# Altium footprint library STM32F103_Warship.PcbLib: 55 footprints (part 1 of 4)
Each footprint in its own frame and in the unit in brackets; x right, y up, seen from the top. Pads: shape width x height; smd on the part's side, far side on the other; paste and mask are expansions set on the pad; w line width, h text height; cw(c..) or ccw(c..) is an arc to the next point about the centre after c.
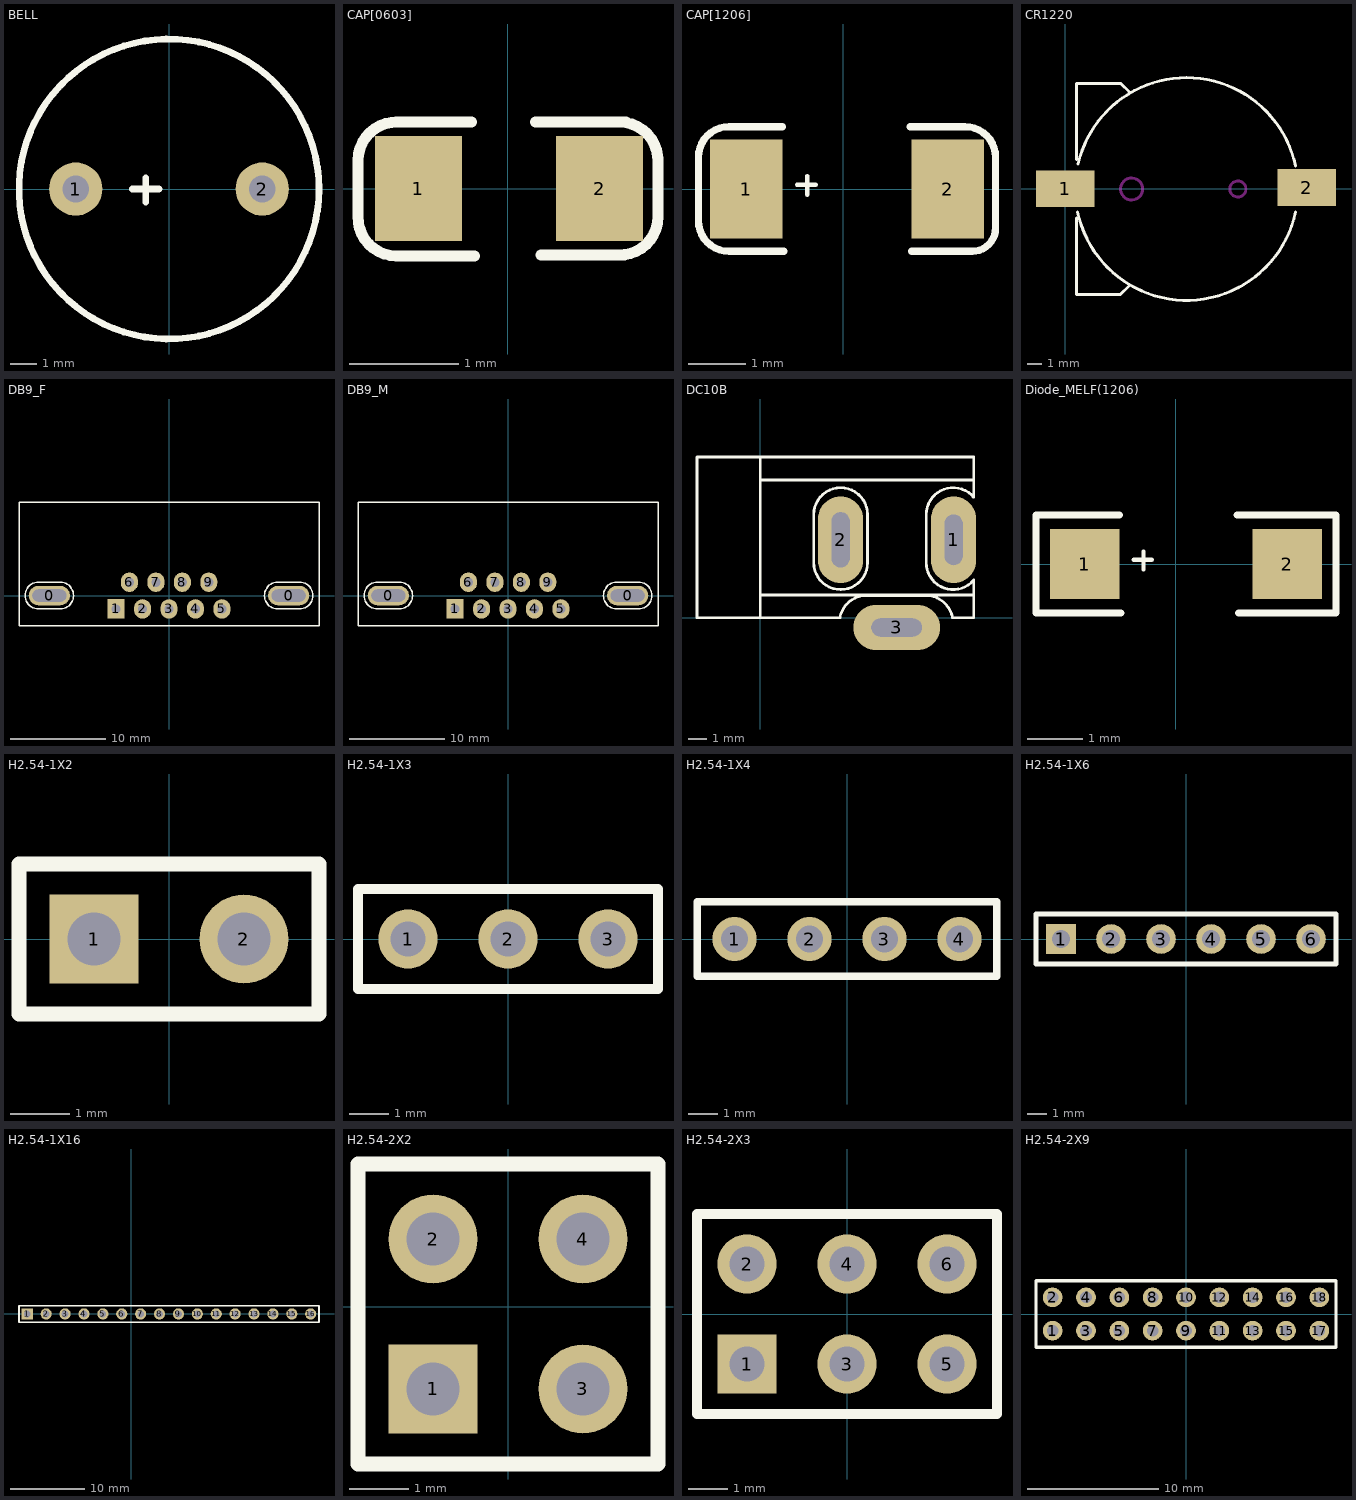
[diagram p0: the footprints below, top view; thin cyan lines are the x and y axes]

## BELL [mil]
pads (2):
  round 80 hole 40: 1(-140,0) 2(140,0)
Top Overlay:
  circle w10: c0,0 r225.16
  lines w10: -55,0 -15,0 ; -35,-20 -35,17
3D body "D7_12.STEP": height 354.33, standoff -78.74, extent -236.22,-236.22 236.22,236.23

## CAP[0603] [mm]
pads (2):
  rect 0.8x0.965 smd: 1(-0.818,0) 2(0.843,0)
Top Overlay:
  lines w0.102: -1.372,-0.254 ccw(c-1.019,-0.264) -1.022,-0.617 -0.305,-0.617 ; -1.372,-0.235 -1.372,0.26 cw(c-1.019,0.257) -1.009,0.61 ; -1.022,0.61 -0.33,0.61 ; 0.254,0.61 1.084,0.61 ; 0.305,-0.61 1.04,-0.61 ; 1.016,-0.61 ccw(c1.026,-0.257) 1.379,-0.26 ; 1.029,0.61 cw(c1.026,0.257) 1.379,0.247 ; 1.379,-0.252 1.379,0.279
3D body "0603_C.step": height 0.88, standoff 0, extent -0.775,-0.404 0.825,0.406

## CAP[1206] [mil]
pads (2):
  rect 50x68 smd: 1(-67,0) 2(72,0)
Top Overlay:
  lines w3: -32,3 -19,3 ; -25,-4 -25,9
  lines w5: -42,43 -79,43 ccw(c-79,22) -100,22 -100,-22 ccw(c-79,-22) -79,-43 -41,-43 ; 46,43 84,43 cw(c84,22) 105,22 105,-27 cw(c89,-27) 89,-43 47,-43
3D body "STEC_A.step": height 63.39, standoff 0, extent -62.81,-31.49 62.81,31.5

## CR1220 [mm] "CR1220"
pads (2):
  rect 4x2.5 smd: 1(0,0) 2(16.475,0.075)
Top Overlay:
  lines w0.2: 0.775,-2.013 0.775,-7.212 3.775,-7.212 4.35,-6.637 ; 0.775,1.987 0.775,7.187 3.775,7.187 4.375,6.587 ; 0.841,-1.605 ccw(c8.275,-0.025) 15.709,-1.605 ; 0.87,1.685 cw(c8.275,-0.025) 8.275,7.575 cw(c8.275,-0.025) 15.709,1.555
Keep-Out Layer:
  circle w0.2: c4.525,-0.025 r0.75
  circle w0.2: c11.775,-0.025 r0.55
3D body "CR1220.STEP": height 4.94, standoff 0, extent -1.036,-7.595 17.464,7.401

## DB9_F [mil]
pads (11):
  oval 170x80 hole 50 slot 140 at 0 deg: 0(-493,0) 0(493,0)
  rect 70x80 hole 38: 1(-218,-55)
  oval 70x80 hole 38: 2(-109,-55) 3(0,-55) 4(109,-55) 5(218,-55) 6(-163,55) 7(-54,55) 8(55,55) 9(164,55)
Top Overlay:
  lines w6: -618,-125 618,-125 618,385 -618,385 -618,-125 ; -538,-55 cw(c-538,0) -538,55 -448,55 cw(c-448,0) -448,-55 -538,-55 ; 448,-55 cw(c448,0) 448,55 538,55 cw(c538,0) 538,-55 448,-55
3D body "SW3dPS-Connector DB-9-f PCB.STEP": height 488.98, standoff 0, extent -611.2,-135 613.21,612.63

## DB9_M [mil]
pads (11):
  oval 170x80 hole 50 slot 140 at 0 deg: 0(-493,0) 0(493,0)
  rect 70x80 hole 38: 1(-218,-55)
  oval 70x80 hole 38: 2(-109,-55) 3(0,-55) 4(109,-55) 5(218,-55) 6(-163,55) 7(-54,55) 8(55,55) 9(164,55)
Top Overlay:
  lines w6: -618,-125 -618,385 618,385 618,-125 -618,-125 ; -538,-55 cw(c-538,0) -538,55 -448,55 cw(c-448,0) -448,-55 -538,-55 ; 448,-55 cw(c448,0) 448,55 538,55 cw(c538,0) 538,-55 448,-55
3D body "SW3dPS-Connector DB-9-m PCB.STEP": height 488.98, standoff 0, extent -616,-124.64 608.41,634.42

## DC10B [mm]
pads (3):
  oval 2.5x4.8 hole 1 slot 2.794 at 90 deg: 1(10.693,4.318)
  oval 2.5x4.8 hole 1 slot 3.048 at 90 deg: 2(4.445,4.318)
  oval 4.8x2.5 hole 1 slot 2.794 at 0 deg: 3(7.544,-0.533)
Top Overlay:
  lines w0.152: 0,1.27 11.811,1.27 ; 0,7.62 11.687,7.62 11.792,7.62 ; 0.127,8.89 -0.381,8.89 -3.5,8.89 -3.5,0 0,0 ; 4.293,0 0,0 ; 4.403,0.004 cw(c5.867,-0.254) 5.867,1.232 9.169,1.232 cw(c9.169,-0.254) 10.633,0.004 ; 10.668,0 11.811,0 11.811,2.032 ; 11.807,2.093 cw(c10.668,3.048) 9.182,3.048 9.181,5.715 cw(c10.668,5.715) 11.807,6.67 11.811,8.89 0,8.89 0,0 ; 5.931,5.715 ccw(c4.445,5.715) 2.959,5.715 2.958,3.048 ccw(c4.445,3.048) 5.931,3.048 5.931,5.715 ; 5.931,5.715 5.932,5.715
3D body "User Library-dc range - dc connector[4840_2201].STEP": height 11.02, standoff -3.48, extent -3.038,-0.685 10.788,8.821

## Diode_MELF(1206) [mil]
pads (2):
  rect 50x50 smd: 1(-65,0) 2(80,0)
Top Overlay:
  lines w3: -30,3 -17,3 ; -23,-4 -23,9
  lines w5: -40,35 -100,35 -100,-35 -39,-35 ; 44,35 115,35 115,-35 45,-35
3D body "Diode MELF.STEP": height 59.53, standoff 0.47, extent -58.89,-29.52 78.9,29.53

## H2.54-1X2 [mm]
pads (2):
  rect 1.5x1.5 hole 0.9: 1(-1.27,0)
  round 1.5 hole 0.9: 2(1.27,0)
Top Overlay:
  lines w0.254: -2.54,-1.27 2.54,-1.27 2.54,1.27 -2.54,1.27 -2.54,-1.27
3D body "1001-2.STEP": height 8.54, standoff -3, extent -2.54,-1.27 2.54,1.27

## H2.54-1X3 [mm]
pads (3):
  round 1.5 hole 0.9: 1(-2.54,0) 2(0,0) 3(2.54,0)
Top Overlay:
  lines w0.254: -3.81,-1.27 3.81,-1.27 3.81,1.27 -3.81,1.27 -3.81,-1.27
3D body "1001-2.STEP": height 8.54, standoff -3, extent -1.27,-1.27 3.81,1.27
3D body "1001-2.STEP": height 8.54, standoff -3, extent -3.81,-1.27 1.27,1.27

## H2.54-1X4 [mm]
pads (4):
  round 1.5 hole 0.9: 1(-3.81,0) 2(-1.27,0) 3(1.27,0) 4(3.81,0)
Top Overlay:
  lines w0.254: -5.08,-1.27 5.08,-1.27 5.08,1.27 -5.08,1.27 -5.08,-1.27
3D body "1001-4.STEP": height 8.54, standoff -3, extent -5.08,-1.27 5.08,1.27

## H2.54-1X6 [mm]
pads (6):
  rect 1.5x1.5 hole 0.9: 1(-6.35,0)
  round 1.5 hole 0.9: 2(-3.81,0) 3(-1.27,0) 4(1.27,0) 5(3.81,0) 6(6.35,0)
Top Overlay:
  lines w0.254: -7.62,-1.27 -7.62,1.27 7.62,1.27 7.62,-1.27 -7.62,-1.27
3D body "1001-6.STEP": height 8.54, standoff -3, extent -7.62,-1.27 7.62,1.27

## H2.54-1X16 [mm]
pads (16):
  rect 1.5x1.5 hole 0.9: 1(-13.97,0)
  round 1.5 hole 0.9: 2(-11.43,0) 3(-8.89,0) 4(-6.35,0) 5(-3.81,0) 6(-1.27,0) 7(1.27,0) 8(3.81,0) 9(6.35,0) 10(8.89,0) 11(11.43,0) 12(13.97,0) 13(16.51,0) 14(19.05,0) 15(21.59,0) 16(24.13,0)
Top Overlay:
  lines w0.254: -15.088,-1.118 -15.088,1.092 25.248,1.092 25.248,-1.118 -15.088,-1.118
3D body "User Library-Header_Male_10Pin.STEP": height 8.54, standoff -3, extent -0.025,-1.245 25.375,1.245
3D body "User Library-Header_Male_10Pin.STEP": height 8.54, standoff -3, extent -15.215,-1.271 10.185,1.219

## H2.54-2X2 [mm]
pads (4):
  rect 1.5x1.5 hole 0.9: 1(-1.27,-1.397)
  round 1.5 hole 0.9: 2(-1.27,1.143) 3(1.27,-1.397) 4(1.27,1.143)
Top Overlay:
  lines w0.254: -2.54,-2.667 2.54,-2.667 2.54,2.413 -2.54,2.413 -2.54,-2.667
3D body "1001-2.STEP": height 8.54, standoff -3, extent -2.54,-0.127 2.54,2.413
3D body "1001-2.STEP": height 8.54, standoff -3, extent -2.54,-2.667 2.54,-0.127

## H2.54-2X3 [mm]
pads (6):
  rect 1.5x1.5 hole 0.9: 1(-2.54,-1.27)
  round 1.5 hole 0.9: 2(-2.54,1.27) 3(0,-1.27) 4(0,1.27) 5(2.54,-1.27) 6(2.54,1.27)
Top Overlay:
  lines w0.254: -3.81,-2.54 -3.81,2.54 3.81,2.54 3.81,-2.54 -3.81,-2.54
3D body "1001-3.STEP": height 2.49, standoff -9.05, extent -3.81,0 3.81,2.54
3D body "1001-3.STEP": height 2.49, standoff -9.05, extent -3.81,-2.54 3.81,0

## H2.54-2X9 [mm]
pads (18):
  round 1.5 hole 0.9: 1(-10.16,-1.27) 2(-10.16,1.27) 3(-7.62,-1.27) 4(-7.62,1.27) 5(-5.08,-1.27) 6(-5.08,1.27) 7(-2.54,-1.27) 8(-2.54,1.27) 9(0,-1.27) 10(0,1.27) 11(2.54,-1.27) 12(2.54,1.27) 13(5.08,-1.27) 14(5.08,1.27) 15(7.62,-1.27) 16(7.62,1.27) 17(10.16,-1.27) 18(10.16,1.27)
Top Overlay:
  lines w0.254: -11.43,-2.54 3.81,-2.54 11.43,-2.54 11.43,2.54 3.81,2.54 -11.43,2.54 -11.43,-2.54
3D body "1001-3.STEP": height 2.49, standoff -9.05, extent 3.81,-2.54 11.43,0
3D body "1001-3.STEP": height 2.49, standoff -9.05, extent 3.81,0 11.43,2.54
3D body "1001-3.STEP": height 2.49, standoff -9.05, extent -11.43,0 -3.81,2.54
3D body "1001-3.STEP": height 2.49, standoff -9.05, extent -11.43,-2.54 -3.81,0
3D body "1001-3.STEP": height 2.49, standoff -9.05, extent -3.81,0 3.81,2.54
3D body "1001-3.STEP": height 2.49, standoff -9.05, extent -3.81,-2.54 3.81,0